# Altium footprint library 00.PcbLib: 150 footprints (part 1 of 10)
Each footprint in its own frame and in the unit in brackets; x right, y up, seen from the top. Pads: shape width x height; smd on the part's side, far side on the other; paste and mask are expansions set on the pad; w line width, h text height; cw(c..) or ccw(c..) is an arc to the next point about the centre after c.
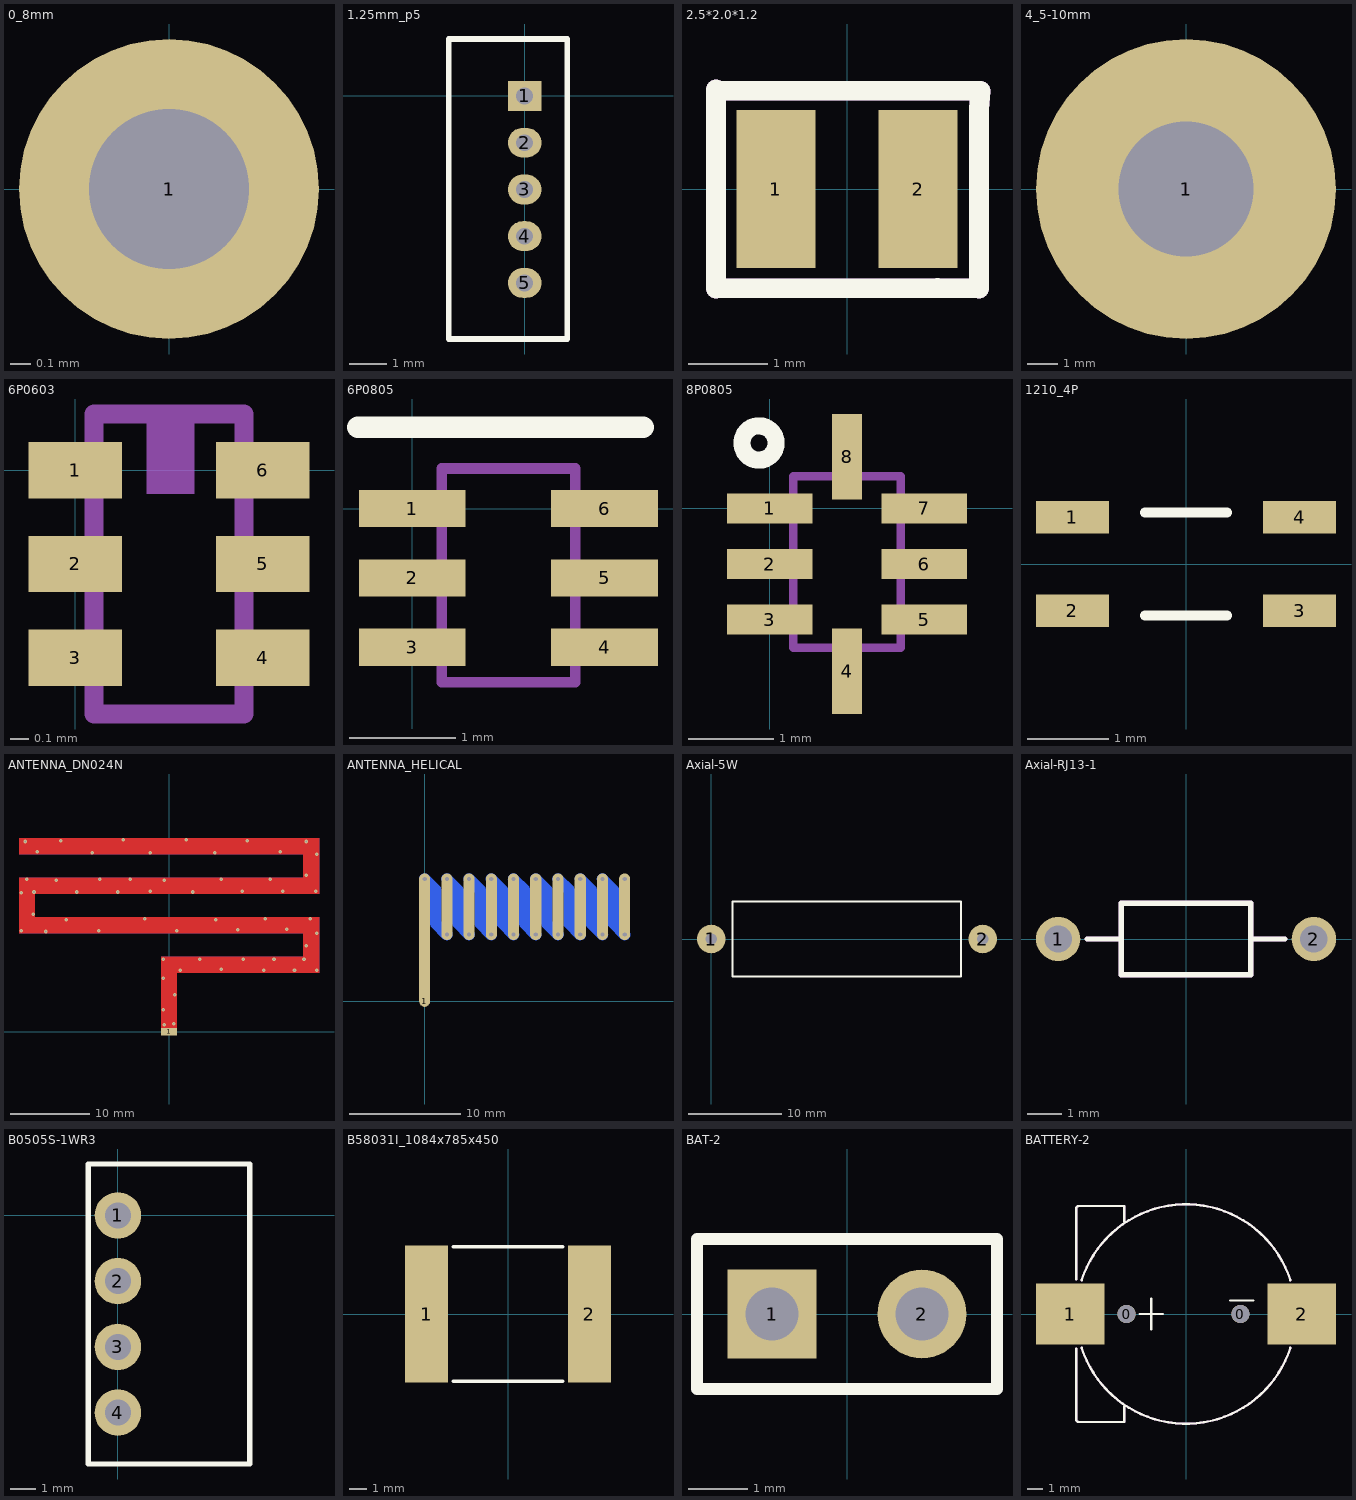
[diagram p0: the footprints below, top view; thin cyan lines are the x and y axes]

## 0_8mm [mm]
pads (1):
  round 1.5 hole 0.8: 1(0,0)

## 1.25mm_p5 [mm]
pads (5):
  rect 0.9x0.8 hole 0.45: 1(0,0)
  oval 0.9x0.8 hole 0.45: 2(0,-1.25) 3(0,-2.5) 4(0,-3.75) 5(0,-5)
Top Overlay:
  lines w0.15: 1.1,-6.5 -2.032,-6.5 -2.032,-0.254 -2.032,1.524 1.143,1.524 1.143,-6.5
3D body "530470510.stp": height 4.28, standoff -2.22, extent -2.057,-6.477 1.143,1.523

## 2.5*2.0*1.2 [mm]
pads (2):
  rect 1x2 smd: 1(-0.9,0) 2(0.9,0)
Top Overlay:
  lines w0.254: -1.66,1.25 1.69,1.24 1.67,1.02 1.67,-1.26 1.145,-1.255 -1.66,-1.26 -1.66,1.26
Top Component Outline (Mech100):
  lines w0.254: -1.66,1.25 1.69,1.24 1.67,1.02 1.67,-1.26 1.145,-1.255 -1.66,-1.26 -1.66,1.26
3D body: height 1.2, standoff 0, extent -1.524,-1.143 1.524,1.143

## 4_5-10mm [mm]
pads (1):
  round 10 hole 4.5: 1(0,0)

## 6P0603 [mm]
pads (6):
  rect 0.5x0.3 smd: 1(0,0) 2(0,-0.5) 3(0,-1) 4(1,-1) 5(1,-0.5) 6(1,0)
Top Component Outline (Mech100):
  rectangle: 0.381,-0.127 0.635,0.3
  lines w0.1: 0.1,-1.3 0.1,0.3 0.9,0.3 0.9,-1.3 0.1,-1.3
3D body: height 0.6, standoff 0, extent 0.1,-1.3 0.9,0.3

## 6P0805 [mm]
pads (6):
  rect 1x0.35 smd: 1(0,0) 2(0,-0.65) 3(0,-1.3) 4(1.8,-1.3) 5(1.8,-0.65) 6(1.8,0)
Top Overlay:
  lines w0.203: -0.508,0.762 2.159,0.762
Top Component Outline (Mech100):
  lines w0.1: 0.275,-1.625 0.275,0.375 1.525,0.375 1.525,-1.625 0.275,-1.625
3D body: height 0.6, standoff 0, extent 0.254,-1.651 1.524,0.381

## 8P0805 [mm]
pads (8):
  rect 1x0.35 smd: 1(0,0) 2(0,-0.65) 3(0,-1.3) 5(1.8,-1.3) 6(1.8,-0.65) 7(1.8,0)
  rect 0.35x1 smd: 4(0.9,-1.9) 8(0.9,0.6)
Top Overlay:
  circle w0.2: c-0.127,0.762 r0.2
Top Component Outline (Mech100):
  lines w0.1: 0.275,-1.625 0.275,0.375 1.525,0.375 1.525,-1.625 0.275,-1.625
3D body: height 0.6, standoff 0, extent 0.254,-1.651 1.524,0.381

## 1210_4P [mm]
pads (4):
  rect 0.9x0.4 smd: 1(-1.4,0.575) 2(-1.4,-0.575) 3(1.4,-0.575) 4(1.4,0.575)
Top Overlay:
  lines w0.12: -0.508,-0.635 0.508,-0.635 ; -0.508,0.635 0.508,0.635
3D body "acp3225.step": height 1.79, standoff -0.12, extent -1.6,-1.143 1.6,1.357

## ANTENNA_DN024N [mm] "ANTENNA_DN024N"
pads (1):
  rect 2x1 smd paste-2 mask+0.102: 1(0,0)
via -18.7,12.8 diameter 0.45 hole 0.2
via -18.7,17.6 diameter 0.45 hole 0.2
via -18.2,24.1 diameter 0.45 hole 0.2
via -18,19.3 diameter 0.45 hole 0.2
via -17.2,14.9 diameter 0.45 hole 0.2
via -17.1,17.7 diameter 0.45 hole 0.2
via -16.7,22.8 diameter 0.45 hole 0.2
via -15.6,12.7 diameter 0.45 hole 0.2
via -14.3,19.2 diameter 0.45 hole 0.2
via -13.7,24.2 diameter 0.45 hole 0.2
via -13,14.2 diameter 0.45 hole 0.2
via -11.7,17.7 diameter 0.45 hole 0.2
via -9.7,22.7 diameter 0.45 hole 0.2
via -8.9,12.8 diameter 0.45 hole 0.2
via -8.8,19.3 diameter 0.45 hole 0.2
via -6.5,17.7 diameter 0.45 hole 0.2
via -5.8,24.3 diameter 0.45 hole 0.2
via -4.9,19.3 diameter 0.45 hole 0.2
via -3.1,14.3 diameter 0.45 hole 0.2
via -2.4,17.8 diameter 0.45 hole 0.2
via -2.4,22.7 diameter 0.45 hole 0.2
via -0.7,2.8 diameter 0.45 hole 0.2
via -0.7,6.8 diameter 0.45 hole 0.2
via -0.7,9.2 diameter 0.45 hole 0.2
via -0.6,0.9 diameter 0.45 hole 0.2
via -0.6,19.2 diameter 0.45 hole 0.2
via 0.6,1 diameter 0.45 hole 0.2
via 0.7,4.7 diameter 0.45 hole 0.2
via 1,12.8 diameter 0.45 hole 0.2
via 1.4,7.8 diameter 0.45 hole 0.2
via 2.2,24.3 diameter 0.45 hole 0.2
via 3,17.7 diameter 0.45 hole 0.2
via 3.9,9.2 diameter 0.45 hole 0.2
via 5.8,22.7 diameter 0.45 hole 0.2
via 5.9,14.2 diameter 0.45 hole 0.2
via 6.6,7.9 diameter 0.45 hole 0.2
via 6.6,19.3 diameter 0.45 hole 0.2
via 8.7,12.9 diameter 0.45 hole 0.2
via 9.3,17.8 diameter 0.45 hole 0.2
via 9.4,9.2 diameter 0.45 hole 0.2
via 9.9,24.2 diameter 0.45 hole 0.2
via 12,7.8 diameter 0.45 hole 0.2
via 12.2,14.3 diameter 0.45 hole 0.2
via 12.8,19.3 diameter 0.45 hole 0.2
via 13.3,9.2 diameter 0.45 hole 0.2
via 14.1,22.8 diameter 0.45 hole 0.2
via 14.4,17.8 diameter 0.45 hole 0.2
via 14.9,13 diameter 0.45 hole 0.2
via 15.9,7.8 diameter 0.45 hole 0.2
via 17.1,9.2 diameter 0.45 hole 0.2
via 17.4,10.9 diameter 0.45 hole 0.2
via 17.4,19.8 diameter 0.45 hole 0.2
via 17.4,24.1 diameter 0.45 hole 0.2
via 17.9,14.3 diameter 0.45 hole 0.2
via 18.6,17.8 diameter 0.45 hole 0.2
via 18.7,7.8 diameter 0.45 hole 0.2
via 18.7,12.5 diameter 0.45 hole 0.2
via 18.7,22.5 diameter 0.45 hole 0.2
Top Layer:
  region: -1,0.5 1,0.5 1,7.5 19,7.5 19,14.5 -17,14.5 -17,17.5 19,17.5 19,24.5 -19,24.5 -19,22.5 17,22.5 17,19.5 -19,19.5 -19,12.5 17,12.5 17,9.5 -1,9.5
Bottom Layer:
  region: -1,0.5 1,0.5 1,7.5 19,7.5 19,14.5 -17,14.5 -17,17.5 19,17.5 19,24.5 -19,24.5 -19,22.5 17,22.5 17,19.5 -19,19.5 -19,12.5 17,12.5 17,9.5 -1,9.5

## ANTENNA_HELICAL [mm]
pads (38):
  round 1 smd paste-1 mask-1: 1(0,0)
  oval 1x12 smd paste-12 mask-12: ""(0,5.5)
  oval 1x2.414 smd far side rot 45 paste-1.5 mask-1.5: ""(0.5,10.5) ""(1.5,6.5) ""(2.5,10.5) ""(3.5,6.5) ""(4.5,10.5) ""(5.5,6.5) ""(6.5,10.5) ""(7.5,6.5) ""(8.5,10.5) ""(9.5,6.5) ""(10.5,10.5) ""(11.5,6.5) ""(12.5,10.5) ""(13.5,6.5) ""(14.5,10.5) ""(15.5,6.5) ""(16.5,10.5) ""(17.5,6.5)
  oval 1x4 smd far side paste-4 mask-4: ""(1,8.5) ""(3,8.5) ""(5,8.5) ""(7,8.5) ""(9,8.5) ""(11,8.5) ""(13,8.5) ""(15,8.5) ""(17,8.5)
  oval 1x6 smd paste-6 mask-6: ""(2,8.5) ""(4,8.5) ""(6,8.5) ""(8,8.5) ""(10,8.5) ""(12,8.5) ""(14,8.5) ""(16,8.5) ""(18,8.5)
via 18,6 diameter 1 hole 0.38
via 16,6 diameter 1 hole 0.38
via 14,6 diameter 1 hole 0.38
via 12,6 diameter 1 hole 0.38
via 10,6 diameter 1 hole 0.38
via 8,6 diameter 1 hole 0.38
via 6,6 diameter 1 hole 0.38
via 4,6 diameter 1 hole 0.38
via 2,6 diameter 1 hole 0.38
via 18,11 diameter 1 hole 0.38
via 16,11 diameter 1 hole 0.38
via 14,11 diameter 1 hole 0.38
via 12,11 diameter 1 hole 0.38
via 10,11 diameter 1 hole 0.38
via 8,11 diameter 1 hole 0.38
via 6,11 diameter 1 hole 0.38
via 4,11 diameter 1 hole 0.38
via 2,11 diameter 1 hole 0.38
via 0,11 diameter 1 hole 0.38

## Axial-5W [mil]
pads (2):
  round 120 hole 47.24 unplated: 1(0,0) 2(1141.74,0)
Top Overlay:
  lines w7.87: 90,-157.5 90,157.5 1050,157.5 1050,-157.5 90,-157.5

## Axial-RJ13-1 [mm]
pads (2):
  round 1.3 hole 0.8: 1(-3.75,0) 2(3.75,0)
Top Overlay:
  lines w0.152: -2.9,0 -1.9,0 ; 1.9,0 2.9,0 ; -1.9,-1.05 1.9,-1.05 1.9,1.05 -1.9,1.05 -1.9,-1.05
Top Component Outline (Mech100):
  lines w0.152: -2.9,0 -1.9,0 ; 1.9,0 2.9,0 ; -1.9,-1.05 1.9,-1.05 1.9,1.05 -1.9,1.05 -1.9,-1.05

## B0505S-1WR3 [mm]
pads (4):
  round 1.8 hole 1: 1(0,0) 2(0,-2.54) 3(0,-5.08) 4(0,-7.62)
Top Overlay:
  lines w0.2: -1.15,-9.61 -1.15,1.99 5.1,1.99 5.1,-9.61 -1.15,-9.61
3D body: height 9.66, standoff 0.5, extent -1.143,-9.652 5.08,2.032

## B58031I_1084x785x450 [mm]
pads (2):
  rect 2.5x8 smd: 1(-4.75,0) 2(4.75,0)
Top Overlay:
  lines w0.2: -3.2,-3.925 3.2,-3.925 ; -3.2,3.925 3.2,3.925
3D body "B58031I_1084x785x450.stp": height 4.5, standoff 0, extent -5.67,-4.175 5.67,4.175

## BAT-2 [mm]
pads (2):
  rect 1.5x1.5 hole 0.9: 1(-1.27,0)
  round 1.5 hole 0.9: 2(1.27,0)
Top Overlay:
  lines w0.2: -2.54,-1.27 -2.54,1.27 2.54,1.27 2.54,-1.27 -2.54,-1.27

## BATTERY-2 [mm]
pads (4):
  round 1.2 hole 1.2 unplated: 0(-3.912,0) 0(3.581,0)
  rect 4.5x4 smd: 1(-7.62,0) 2(7.62,0)
Top Overlay:
  lines w0.152: -7.22,-2.286 -7.22,-7.004 -7.112,-7.112 -4.064,-7.112 -4.064,-6.096 ; -7.22,2.286 -7.22,7.004 -7.112,7.112 -4.064,7.112 -4.064,6.096 ; -6.867,-2.231 ccw(c0,0) 6.867,-2.231 ; -6.867,2.231 cw(c0,0) 6.867,2.231 ; -3.048,0 -1.524,0 ; -2.286,-1.016 -2.286,1.016 ; 2.909,0.889 4.433,0.889
Top Component Outline (Mech100):
  lines w0.152: -7.22,-2.286 -7.22,-7.004 -7.112,-7.112 -4.064,-7.112 -4.064,-6.096 ; -7.22,2.286 -7.22,7.004 -7.112,7.112 -4.064,7.112 -4.064,6.096 ; -6.867,-2.231 ccw(c0,0) 6.867,-2.231 ; -6.867,2.231 cw(c0,0) 6.867,2.231
3D body: height 3.8, standoff 0, extent -7.22,-7.217 7.22,7.217